# Altium footprint library B105rlc.PcbLib: 103 footprints (part 7 of 7)
Each footprint in its own frame and in the unit in brackets; x right, y up, seen from the top. Pads: shape width x height; smd on the part's side, far side on the other; paste and mask are expansions set on the pad; w line width, h text height; cw(c..) or ccw(c..) is an arc to the next point about the centre after c.
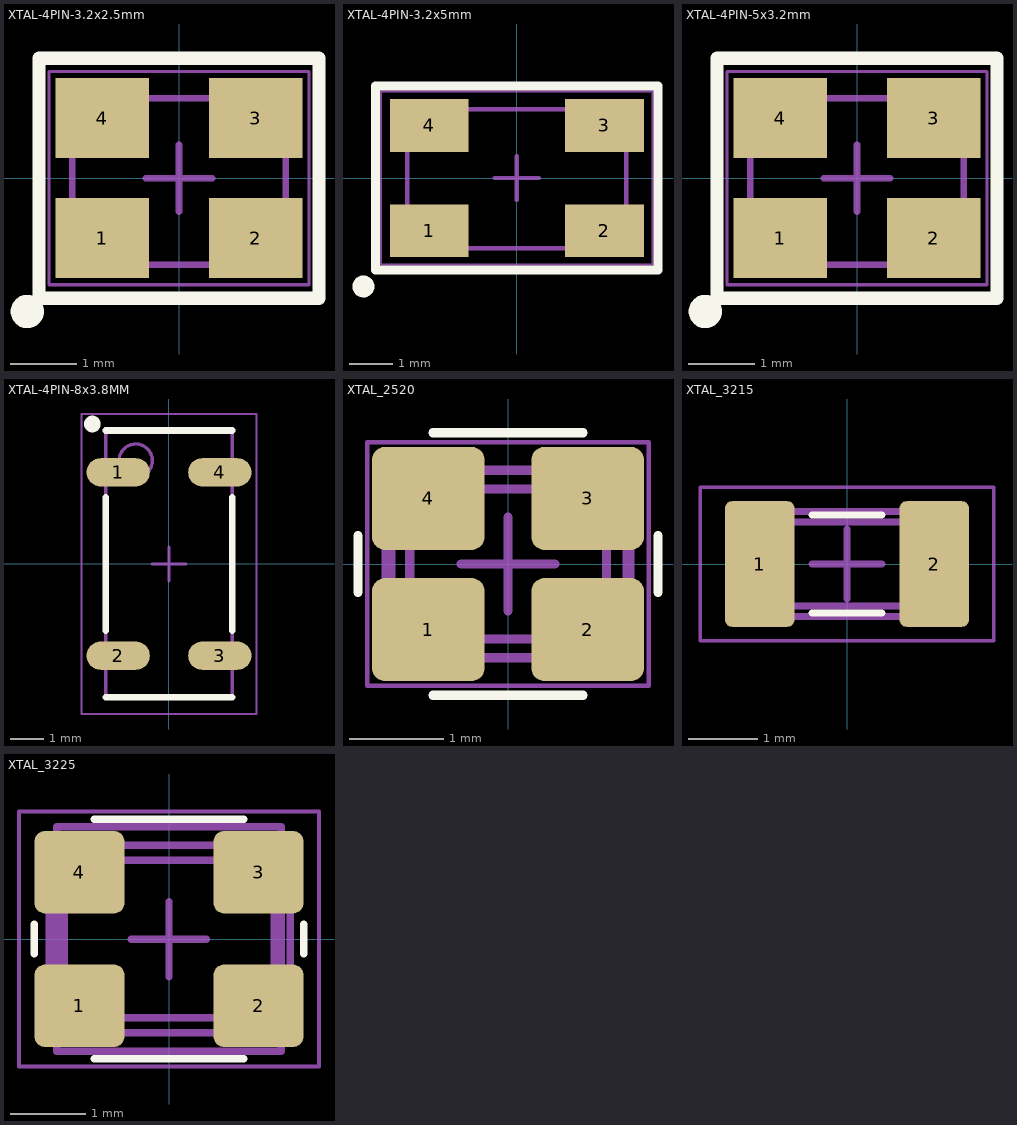
[diagram p6: the footprints below, top view; thin cyan lines are the x and y axes]

## XTAL-4PIN-3.2x2.5mm [mm] "XTAL-4PIN-3.2mmx2.5mm"
height 1
pads (4):
  rect 1.4x1.2 smd: 1(-1.15,-0.9) 2(1.15,-0.9) 3(1.15,0.9) 4(-1.15,0.9)
Top Overlay:
  circle w0.25: c-2.275,-2 r0.125
  lines w0.2: -2.1,-1.8 0.1,-1.8 2.1,-1.8 2.1,1.8 0.2,1.8 -2.1,1.8 -2.1,-1.8
Mechanical 13:
  lines w0.1: -1.6,-1.3 -1.6,1.2 1.6,1.2 1.6,-1.3 -1.6,-1.3
Mechanical 15:
  lines w0.05: -1.95,-1.6 -1.95,1.6 1.95,1.6 1.95,-1.6 -1.95,-1.6
  lines w0.1: -0.5,0 0.5,0 ; 0,-0.5 0,0.5
3D body "Xtal-ABM8G.step": height 1.01, standoff 0, extent -1.6,-1.3 1.6,1.2

## XTAL-4PIN-3.2x5mm [mm] "XTAL-4PIN-3.2mmx5mm"
height 1
pads (4):
  rect 1.8x1.2 smd: 1(-2,-1.2) 2(2,-1.2) 3(2,1.2) 4(-2,1.2)
Top Overlay:
  circle w0.25: c-3.5,-2.475 r0.125
  lines w0.2: -3.225,-2.1 3.225,-2.1 3.225,2.1 -3.225,2.1 -3.225,-2.1
Mechanical 13:
  lines w0.1: -2.5,-1.6 -2.5,1.575 2.5,1.575 2.5,-1.6 -2.5,-1.6
Mechanical 15:
  lines w0.05: -3.1,-1.975 -3.1,1.975 3.1,1.975 3.1,-1.975 -3.1,-1.975
  lines w0.1: -0.5,0 0.5,0 ; 0,-0.5 0,0.5
3D body "Crystal-2x32.step": height 0.9, standoff -0.05, extent -2.5,-1.6 2.5,1.6

## XTAL-4PIN-5x3.2mm [mm] "XTAL-4PIN-3.2mmx2mm"
height 1
pads (4):
  rect 1.4x1.2 smd: 1(-1.15,-0.9) 2(1.15,-0.9) 3(1.15,0.9) 4(-1.15,0.9)
Top Overlay:
  circle w0.25: c-2.275,-2 r0.125
  lines w0.2: -2.1,-1.8 0.1,-1.8 2.1,-1.8 2.1,1.8 0.2,1.8 -2.1,1.8 -2.1,-1.8
Mechanical 13:
  lines w0.1: -1.6,-1.3 -1.6,1.2 1.6,1.2 1.6,-1.3 -1.6,-1.3
Mechanical 15:
  lines w0.05: -1.95,-1.6 -1.95,1.6 1.95,1.6 1.95,-1.6 -1.95,-1.6
  lines w0.1: -0.5,0 0.5,0 ; 0,-0.5 0,0.5
3D body "Xtal-ABM8G.step": height 1.01, standoff 0, extent -1.6,-1.3 1.6,1.2

## XTAL-4PIN-8x3.8MM [mm] "4-Leads, Body 8.00x3.80mm, Pitch 5.50mm"
height 2.5
pads (4):
  oval 1.9x0.85 smd: 1(-1.525,2.75) 2(-1.525,-2.75) 3(1.525,-2.75) 4(1.525,2.75)
Top Overlay:
  circle w0.25: c-2.3,4.2 r0.125
  lines w0.2: -1.9,-2 -1.9,2 ; -1.898,-3.996 1.902,-3.996 ; -1.898,4.004 1.902,4.004 ; 1.9,-2 1.9,2
Mechanical 13:
  circle w0.1: c-1,3.1 r0.5
  lines w0.1: -1.9,-4 1.9,-4 1.9,4 -1.9,4 -1.9,-4
Mechanical 15:
  lines w0.05: -2.625,-4.5 2.625,-4.5 2.625,4.5 -2.625,4.5 -2.625,-4.5
  lines w0.1: -0.5,0 0.5,0 ; 0,-0.5 0,0.5
3D body "XTAL 8x3.8mm.step": height 2.43, standoff -0.1, extent -1.898,-3.996 1.902,4.004

## XTAL_2520 [mm]
pads (4):
  rrect25% 1.2x1.1 smd: 1(-0.85,-0.7) 2(0.85,-0.7) 3(0.85,0.7) 4(-0.85,0.7)
Top Overlay:
  lines w0.1: -1.6,-0.3 -1.6,0.3 ; -0.8,-1.4 0.8,-1.4 ; -0.8,1.4 0.8,1.4 ; 1.6,-0.3 1.6,0.3
Mechanical 5:
  circle w0.254: c-0.9,-0.6 r0.1
  lines w0.1: -1.3,-1 1.3,-1 1.3,1 -1.3,1 -1.3,-1
  text ".Designator" at 0.4,-0.5 h0.6
Mechanical 13:
  lines w0.1: -1.25,-1 1.27,-1 1.27,1 -1.25,1 -1.25,-1 ; -1.05,-0.6 -0.85,-0.8 0.85,-0.8 1.05,-0.6 1.05,0.6 0.85,0.8 -0.85,0.8 -1.05,0.6 -1.05,-0.6
Mechanical 15:
  lines w0.05: -1.5,-1.3 -1.5,1.3 1.5,1.3 1.5,-1.3 -1.5,-1.3
  lines w0.1: -0.5,0 0.5,0 ; 0,-0.5 0,0.5
3D body "User Library-GeyerElectronics_KX6.step": height 0.56, standoff 0, extent -1.25,-1 1.27,1
3D body: height 0.56, standoff 0.15, extent -1.05,-0.8 1.05,0.8

## XTAL_3215 [mm]
pads (2):
  rrect20% 1x1.8 smd: 1(-1.25,0) 2(1.25,0)
Top Overlay:
  lines w0.1: -0.5,-0.7 0.5,-0.7 ; -0.5,0.7 0.5,0.7
Mechanical 5:
  lines w0.1: -1.3,-0.6 1.3,-0.6 1.3,0.6 -1.3,0.6 -1.3,-0.6
  text ".Designator" at -0.7,-0.3 h0.6
Mechanical 13:
  lines w0.1: -1.6,-0.75 1.6,-0.75 1.6,0.75 -1.6,0.75 -1.6,-0.75
Mechanical 15:
  lines w0.05: -2.1,-1.1 2.1,-1.1 2.1,1.1 -2.1,1.1 -2.1,-1.1
  lines w0.1: -0.5,0 0.5,0 ; 0,-0.5 0,0.5
3D body "User Library-Siward_SX3215.step": height 0.81, standoff 0, extent -1.6,-0.75 1.6,0.75

## XTAL_3225 [mm]
pads (4):
  rrect25% 1.2x1.1 smd: 1(-1.194,-0.89) 2(1.194,-0.89) 3(1.194,0.891) 4(-1.194,0.891)
Top Overlay:
  lines w0.1: -1.8,-0.2 -1.8,0.2 ; -1,-1.6 1,-1.6 ; -1,1.6 1,1.6 ; 1.8,-0.2 1.8,0.2
Mechanical 5:
  circle w0.254: c-1.1,-1.1 r0.1
  lines w0.1: -1.5,-1.5 -1.5,1.5 1.5,1.5 1.5,-1.5 -1.5,-1.5
  text ".Designator" at 0.4,-0.6 h0.6
Mechanical 13:
  lines w0.1: -1.6,-1.25 1.614,-1.25 1.614,1.25 -1.6,1.25 -1.6,-1.25 ; -1.4,-0.85 -1.4,0.85 -1.2,1.05 1.2,1.05 1.4,0.85 1.4,-0.85 1.2,-1.05 -1.2,-1.05 -1.4,-0.85
Mechanical 15:
  lines w0.05: -2,-1.7 2,-1.7 2,1.7 -2,1.7 -2,-1.7
  lines w0.1: -0.5,0 0.5,0 ; 0,-0.5 0,0.5
3D body "Crystal TXC Corp 7M series.STEP": height 0.8, standoff 0, extent -1.65,-1.3 1.65,1.3